# Altium footprint library PCBLIB.PcbLib: 557 footprints (part 15 of 36)
Each footprint in its own frame and in the unit in brackets; x right, y up, seen from the top. Pads: shape width x height; smd on the part's side, far side on the other; paste and mask are expansions set on the pad; w line width, h text height; cw(c..) or ccw(c..) is an arc to the next point about the centre after c.
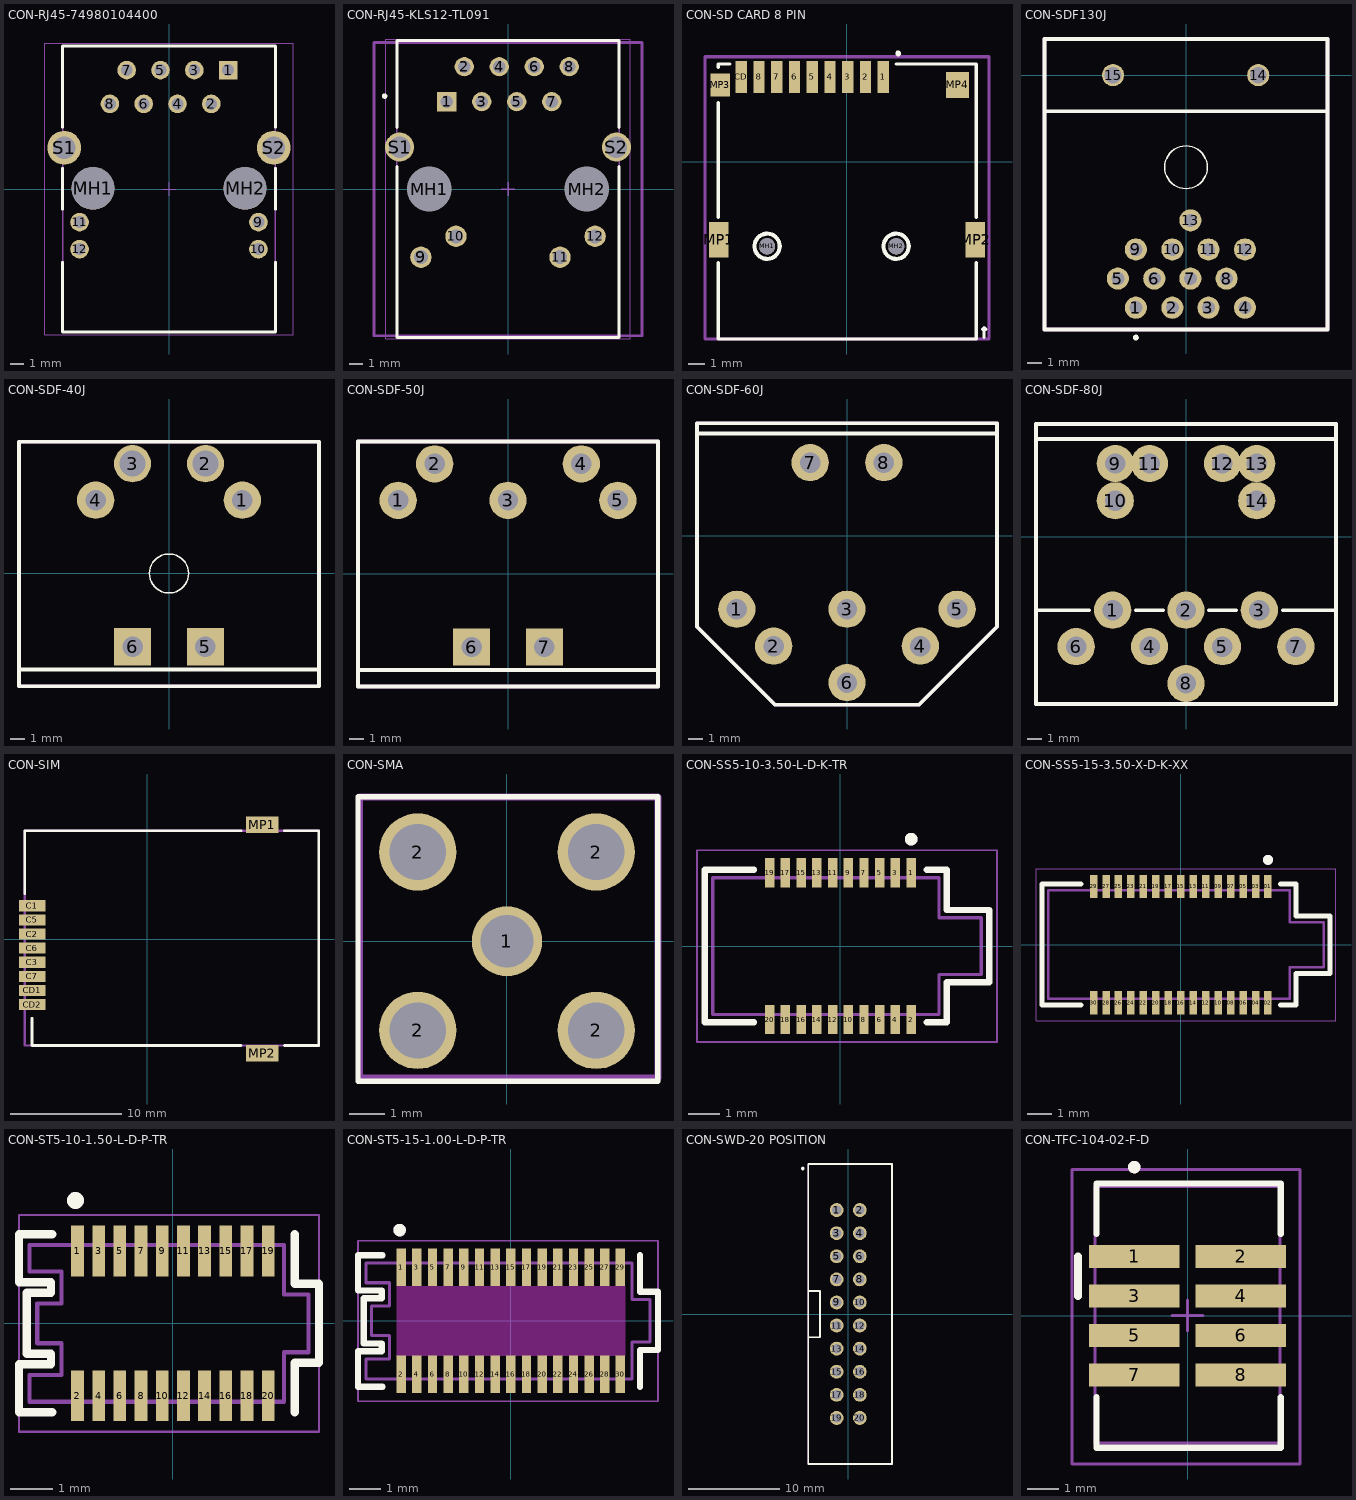
[diagram p14: the footprints below, top view; thin cyan lines are the x and y axes]

## CON-RJ45-74980104400 [mm] "10/100Base-T, THT, 1x1, Tab up, w/o shield tabs, LED L-R yellow-green/yellow-green, THR"
height 13.85
pads (16):
  rect 1.4x1.4 hole 0.89: 1(4.44,8.94)
  round 1.4 hole 0.89: 2(3.18,6.4) 3(1.9,8.94) 4(0.64,6.4) 5(-0.64,8.94) 6(-1.9,6.4) 7(-3.18,8.94) 8(-4.44,6.4) 9(6.725,-2.49) 10(6.725,-4.52) 11(-6.725,-2.49) 12(-6.725,-4.52)
  round 3.2 hole 3.2 unplated: MH1(-5.715,0.05) MH2(5.715,0.05)
  round 2.55 hole 1.7: S1(-7.875,3.1) S2(7.875,3.1)
Top Overlay:
  lines w0.2: -8,-5.5 -8,-10.75 8,-10.75 8,-5.5 ; -8,-1.51 -8,1.55 ; -8,4.65 -8,10.75 8,10.75 8,4.65 ; 8,-1.51 8,1.55
Top Paste:
  region: -3.33,7.5 -5.53,7.5 -5.53,4.7 -3.33,4.7
  region: -0.79,7.5 -2.99,7.5 -2.99,4.7 -0.79,4.7
  region: 1.75,7.5 -0.45,7.5 -0.45,4.7 1.75,4.7
  region: 4.29,7.5 2.09,7.5 2.09,4.7 4.29,4.7
  region: -2.07,7.84 -4.27,7.84 -4.27,10.64 -2.07,10.64
  region: 5.55,7.84 3.35,7.84 3.35,10.64 5.55,10.64
  region: 3.01,7.84 0.81,7.84 0.81,10.64 3.01,10.64
  region: 0.47,7.84 -1.73,7.84 -1.73,10.64 0.47,10.64
  region: -4.475,1.8 -11.275,1.8 -11.275,4.4 -4.475,4.4
  region: 11.275,1.8 4.475,1.8 4.475,4.4 11.275,4.4
  region: -8.625,-3.29 -4.825,-3.29 -4.825,-1.69 -8.625,-1.69
  region: 8.625,-3.29 4.825,-3.29 4.825,-1.69 8.625,-1.69
  region: -8.625,-5.32 -4.825,-5.32 -4.825,-3.72 -8.625,-3.72
  region: 8.625,-5.32 4.825,-5.32 4.825,-3.72 8.625,-3.72
Dimensions:
  text "The stencil layout appplied for / PCB 1.6mm and Stencil 0.15mm" at -9.47,-15.04 h1.02
Mechanical 15:
  lines w0.05: -0.5,0 0.5,0 ; 0,-0.5 0,0.5 ; -9.35,-10.95 -9.35,10.95 9.35,10.95 9.35,-10.95 -9.35,-10.95
ASM Top:
  lines w0.1: -8,-10.75 8,-10.75 8,10.75 -8,10.75 -8,-10.75
  text ".designator" at -0.244,0 h0.8
3D body "74980104400.stp": height 13.7, standoff -3, extent -8.06,-10.75 8.06,10.75

## CON-RJ45-KLS12-TL091 [mm] "MagJack, 14-Leads, Body 21.59x16.13mm"
height 13.84
pads (16):
  rect 1.4x1.4 hole 0.89: 1(-4.445,6.35)
  round 1.4 hole 0.89: 2(-3.175,8.89) 3(-1.905,6.35) 4(-0.635,8.89) 5(0.635,6.35) 6(1.905,8.89) 7(3.175,6.35) 8(4.445,8.89)
  round 1.55 hole 1.02: 9(-6.325,-4.95) 10(-3.78,-3.43) 11(3.78,-4.95) 12(6.325,-3.43)
  round 2.95 hole 3.25 unplated: MH1(-5.715,0) MH2(5.715,0)
  round 2.1 hole 1.57: S1(-7.875,3.05) S2(7.875,3.05)
Top Overlay:
  circle w0.2: c-8.966,6.756 r0.1
  lines w0.2: -8.065,1.636 -8.065,-10.79 8.065,-10.79 8.065,1.636 ; -8.065,4.464 -8.065,10.8 8.065,10.8 8.065,4.464
Mechanical 13:
  lines w0.1: -8.065,-10.79 -8.065,10.8 8.065,10.8 8.065,-10.79 -8.065,-10.79
Mechanical 15:
  lines w0.05: -8.895,-10.89 -8.895,10.9 8.895,10.9 8.895,-10.89 -8.895,-10.89
  lines w0.1: -0.5,0 0.5,0 ; 0,-0.5 0,0.5
ASM Top:
  lines w0.2: -9.724,-10.65 -9.724,10.65 9.724,10.65 9.724,-10.65 -9.724,-10.65
  text ".designator" at -0.5,0 h0.8
3D body "74990111217_Download_STP_74990111217_rev1.stp": height 15.29, standoff -3.14, extent -9.724,-10.65 9.724,10.65

## CON-SD CARD 8 PIN [mm]
pads (15):
  rect 0.7x2 smd: 1(2.25,5.25) 2(1.15,5.25) 3(0.05,5.25) 4(-1.05,5.25) 5(-2.15,5.25) 6(-3.25,5.25) 7(-4.35,5.25) 8(-5.45,5.25) CD(-6.55,5.25)
  round 1 hole 1 unplated: MH1(-4.95,-5.25) MH2(3.05,-5.25)
  rect 1.2x2.2 smd: MP1(-7.95,-4.85) MP2(7.95,-4.85)
  rect 1.2x1.4 smd: MP3(-7.85,4.75)
  rect 1.4x1.6 smd: MP4(6.85,4.75)
Top Overlay:
  circle w0.254: c-4.95,-5.25 r0.781
  circle w0.254: c3.05,-5.25 r0.781
  circle w0.254: c3.172,6.705 r0.05
  lines w0.2: -7.987,-6.25 -7.987,-11 8.013,-11 8.013,-6.25 ; -7.987,-3.45 -7.987,3.65 ; -7.987,5.85 -7.987,6.05 -7.25,6.05 ; 3.05,6.05 8.013,6.05 8.013,-3.45 ; 8.4,-10.4 8.5,-10.3 ; 8.5,-10.9 8.5,-10.3 ; 8.6,-10.4 8.5,-10.3
ASM Top:
  lines w0.2: -8.8,-11 8.8,-11 8.8,6.5 -8.8,6.5 -8.8,-11
  text ".designator" at -2.1,-3 h0.8
3D body "User Library-Socket-MicroSD.step": height 1.86, standoff -0.59, extent -8,-11.05 8,6

## CON-SDF130J [mil]
pads (15):
  round 60 hole 35: 1(-136,-631) 2(-37,-631) 3(61,-631) 4(160,-631) 5(-185,-552) 6(-86,-552) 7(12,-552) 8(110,-552) 9(-136,-473) 10(-37,-473) 11(61,-473) 12(160,-473) 13(12,-394)
  round 60 hole 45: 14(196,0) 15(-198,0)
Top Overlay:
  circle w7.87: c-136,-712 r3.94
  circle w4: c0,-250 r58.01
  lines w10: -384,-98 384,-98 ; -384,-690 -384,98 384,98 384,-690 -384,-690
ASM Top:
  lines w10: -384,-690 -384,98.03 383.72,98.03 383.72,-690 -384,-690
  text ".designator" at -293,-290 h31.5
3D body "CUI_INC_SDF-130J.step": height 787.9, standoff -133.36, extent -384,-650 383.72,98.03

## CON-SDF-40J [mil]
pads (6):
  round 100 hole 55: 1(197,197) 4(-197,197)
  round 100 hole 70: 2(98,295) 3(-98,295)
  rect 100x100 hole 55: 5(98,-197) 6(-98,-197)
Top Overlay:
  circle w4: c0,0 r52.48
  lines w10: -403,-258 403,-258 ; -403,-303 403,-303 403,354 -403,354 -403,-303
ASM Top:
  lines w10: -403,-303 403,-303 403,354 -403,354 -403,-303
  text ".designator" at -294,21 h31.5
3D body "CUI_INC_SDF-40J.step": height 843.02, standoff -137.29, extent -404,-302 410.96,327.92
3D body: height 10, standoff 0, extent -12,120 -12,120

## CON-SDF-50J [mil]
pads (7):
  round 100 hole 55: 1(-295,197) 2(-197,295) 3(0,197) 4(197,295) 5(295,197)
  rect 100x100 hole 55: 6(-98,-197) 7(98,-197)
Top Overlay:
  lines w10: -403,-259 403,-259 ; -403,-303 403,-303 403,355 -403,355 -403,-303
ASM Top:
  lines w10: -403,-303 403,-303 403,355 -403,355 -403,-303
  text ".designator" at -295,18 h31.5
3D body "CUI_INC_SDF-50J.step": height 843.02, standoff -137.29, extent -408,-301.11 406.96,317

## CON-SDF-60J [mil]
pads (8):
  round 100 hole 55: 1(-296,-197) 2(-197,-296) 3(0,-197) 4(197,-296) 5(296,-197) 6(0,-394) 7(-99,197) 8(99,197)
Top Overlay:
  lines w10: -403,275 403,275 ; -403,-244 -193,-454 193,-454 403,-244 403,303 -403,303 -403,-244
ASM Top:
  lines w10: -403,-244 -193,-454 193,-454 403,-244 403,303 -403,303 -403,-244
  text ".designator" at -348,-17 h31.5
3D body "CUI_INC_SDF-60J.step": height 843.02, standoff -137.29, extent -408,-401.69 406.96,305

## CON-SDF-80J [mil]
pads (14):
  round 100 hole 55: 1(-197,-197) 2(0,-197) 3(197,-197) 4(-98,-295) 5(98,-295) 6(-295,-295) 7(295,-295) 8(0,-394) 9(-190,197) 10(-190,97) 11(-98,197) 12(98,197) 13(190,197) 14(190,97)
Top Overlay:
  lines w10: -403,-197 -260,-197 ; -403,263 403,263 ; -135,-197 -61,-197 ; 62,-197 135,-197 ; 260,-197 403,-197 ; -403,-449 403,-449 403,303 -403,303 -403,-449
ASM Top:
  lines w10: -403,-449 -403,303 -394,303 403,303 403,-449 -403,-449
  text ".designator" at -234,-23 h31.5
3D body "CUI_INC_SDF-80J.step": height 843.02, standoff -137.29, extent -407.96,-438 407,300.19

## CON-SIM [mm] "MOLEX:0475530001,KLS:693013050811"
height 1.8
pads (10):
  rect 2.4x1 smd mask+0.2: C1(-10.35,2.995) C2(-10.349,0.445) C3(-10.349,-2.095) C5(-10.349,1.715) C6(-10.349,-0.825) C7(-10.349,-3.365) CD1(-10.349,-4.635) CD2(-10.349,-5.905)
  rect 2.95x1.5 smd mask+0.2: MP1(10.35,10.275) MP2(10.35,-10.275)
Top Overlay:
  lines w0.254: -11.03,4.105 -11.03,5.56 ; -10.383,-7.135 -10.383,-9.6 8.45,-9.6 ; 8.45,9.75 -11.029,9.75 -11.029,5.559 ; 12.35,-9.6 15.451,-9.6 15.451,9.75 12.35,9.75 ; -11.03,5.56 -11.029,5.559
ASM Top:
  lines w0.2: -11.029,-9.6 -11.029,9.75 15.47,9.75 15.47,-9.581 15.451,-9.6 -11.029,-9.6 ; -11.029,-9.6 -11.029,-9.6
  text ".designator" at 0,0 h0.8
3D body "475530001.stp": height 1.81, standoff -0.02, extent -11.029,-10.4 15.471,10.55

## CON-SMA [mm]
pads (5):
  round 2 hole 1.5: 1(0,0)
  round 2.2 hole 1.6: 2(-2.54,-2.54) 2(-2.54,2.54) 2(2.54,-2.54) 2(2.54,2.54)
Top Overlay:
  lines w0.152: -4.242,-3.988 4.293,-3.988 4.293,4.115 -4.242,4.115 -4.242,-3.988
ASM Top:
  lines w0.2: -4.2,-3.9 4.3,-3.9 4.3,4.1 -4.2,4.1 -4.2,-3.9
  text ".designator" at -0.3,-0.1 h0.8
3D body "sma.STEP": height 9.55, standoff -3.9, extent -3.155,-3.155 3.155,3.155

## CON-SS5-10-3.50-L-D-K-TR [mm] "0.50 mm pitch"
pads (20):
  rect 0.3x0.93 smd mask+0.05: 1(2.25,2.335) 2(2.25,-2.335) 3(1.75,2.335) 4(1.75,-2.335) 5(1.25,2.335) 6(1.25,-2.335) 7(0.75,2.335) 8(0.75,-2.335) 9(0.25,2.335) 10(0.25,-2.335) 11(-0.25,2.335) 12(-0.25,-2.335) 13(-0.75,2.335) 14(-0.75,-2.335) 15(-1.25,2.335) 16(-1.25,-2.335) 17(-1.75,2.335) 18(-1.75,-2.335) 19(-2.25,2.335) 20(-2.25,-2.335)
Top Overlay:
  circle w0.2: c2.25,3.4 r0.1
  lines w0.2: -2.75,-2.425 -4.31,-2.425 -4.31,2.425 -2.75,2.425 ; 2.75,-2.425 3.38,-2.425 3.38,-1.15 4.73,-1.15 4.73,1.15 3.38,1.15 3.38,2.425 2.75,2.425
Mechanical 13:
  circle w0.2: c2.25,3.4 r0.1
Mechanical 15:
  lines w0.05: -4.56,-3.05 -4.56,3.05 4.98,3.05 4.98,-3.05 -4.56,-3.05
ASM Top:
  lines w0.1: -4.06,-2.175 3.13,-2.175 3.13,-0.9 4.48,-0.9 4.48,0.9 3.13,0.9 3.13,2.175 -4.06,2.175 -4.06,-2.175
  text ".designator" at -1.25,-0.283 h0.8
3D body "SS5-10-3.50-L-D-K-TR.stp": height 4.01, standoff 0.01, extent -4.06,-2.5 4.48,2.5

## CON-SS5-15-3.50-X-D-K-XX [mm]
pads (30):
  rect 0.3x0.93 smd mask+0.051: 01(3.5,2.335) 02(3.5,-2.335) 03(3,2.335) 04(3,-2.335) 05(2.5,2.335) 06(2.5,-2.335) 07(2,2.335) 08(2,-2.335) 09(1.5,2.335) 10(1.5,-2.335) 11(1,2.335) 12(1,-2.335) 13(0.5,2.335) 14(0.5,-2.335) 15(0,2.335) 16(0,-2.335) 17(-0.5,2.335) 18(-0.5,-2.335) 19(-1,2.335) 20(-1,-2.335) 21(-1.5,2.335) 22(-1.5,-2.335) 23(-2,2.335) 24(-2,-2.335) 25(-2.5,2.335) 26(-2.5,-2.335) 27(-3,2.335) 28(-3,-2.335) 29(-3.5,2.335) 30(-3.5,-2.335)
Top Overlay:
  circle w0.2: c3.5,3.4 r0.1
  lines w0.2: -4,-2.425 -5.56,-2.425 -5.56,2.425 -4,2.425 ; 4,-2.425 4.63,-2.425 4.63,-1.15 5.98,-1.15 5.98,1.15 4.63,1.15 4.63,2.425 4,2.425
Mechanical 13:
  circle w0.2: c3.5,3.4 r0.1
Mechanical 15:
  lines w0.05: -5.81,-3.05 6.23,-3.05 6.23,3.05 -5.81,3.05 -5.81,-3.05
ASM Top:
  lines w0.1: -5.31,-2.175 -5.31,2.175 4.38,2.175 4.38,0.9 5.73,0.9 5.73,-0.9 4.38,-0.9 4.38,-2.175 -5.31,-2.175
  text ".designator" at -0.7,-0.25 h0.8
3D body "SS5-15-3.50-L-D-K-TR.stp": height 4.01, standoff 0.01, extent -5.31,-2.5 5.73,2.5

## CON-ST5-10-1.50-L-D-P-TR [mm]
pads (20):
  rect 0.3x1.2 smd mask+0.05: 1(-2.25,1.71) 2(-2.25,-1.71) 3(-1.75,1.71) 4(-1.75,-1.71) 5(-1.25,1.71) 6(-1.25,-1.71) 7(-0.75,1.71) 8(-0.75,-1.71) 9(-0.25,1.71) 10(-0.25,-1.71) 11(0.25,1.71) 12(0.25,-1.71) 13(0.75,1.71) 14(0.75,-1.71) 15(1.25,1.71) 16(1.25,-1.71) 17(1.75,1.71) 18(1.75,-1.71) 19(2.25,1.71) 20(2.25,-1.71)
Top Overlay:
  circle w0.2: c-2.3,2.9 r0.1
  lines w0.2: -2.85,-2.1 -3.63,-2.1 -3.63,-0.97 -2.875,-0.97 -2.875,-0.72 -3.45,-0.72 -3.45,0.72 -2.875,0.72 -2.875,0.97 -3.63,0.97 -3.63,2.1 -2.85,2.1 ; 2.875,-2.1 2.875,-0.93 3.45,-0.93 3.45,0.93 2.875,0.93 2.875,2.1
Mechanical 13:
  circle w0.2: c-2.3,2.9 r0.1
Mechanical 15:
  lines w0.05: -3.63,-2.56 -3.63,2.56 3.45,2.56 3.45,-2.56 -3.63,-2.56
ASM Top:
  lines w0.1: -3.38,-1.85 2.625,-1.85 2.625,-0.68 3.2,-0.68 3.2,0.68 2.625,0.68 2.625,1.85 -3.38,1.85 -3.38,1.22 -2.625,1.22 -2.625,0.47 -3.2,0.47 -3.2,-0.47 -2.625,-0.47 -2.625,-1.22 -3.38,-1.22 -3.38,-1.85
  text ".designator" at -0.7,-0.45 h0.8
3D body "ST5-10-1.50-L-D-P-TR.stp": height 4.09, standoff 0.01, extent -3.38,-2 3.2,2

## CON-ST5-15-1.00-L-D-P-TR [mm]
pads (30):
  rect 0.3x1.2 smd mask+0.05: 1(-3.5,1.71) 2(-3.5,-1.71) 3(-3,1.71) 4(-3,-1.71) 5(-2.5,1.71) 6(-2.5,-1.71) 7(-2,1.71) 8(-2,-1.71) 9(-1.5,1.71) 10(-1.5,-1.71) 11(-1,1.71) 12(-1,-1.71) 13(-0.5,1.71) 14(-0.5,-1.71) 15(0,1.71) 16(0,-1.71) 17(0.5,1.71) 18(0.5,-1.71) 19(1,1.71) 20(1,-1.71) 21(1.5,1.71) 22(1.5,-1.71) 23(2,1.71) 24(2,-1.71) 25(2.5,1.71) 26(2.5,-1.71) 27(3,1.71) 28(3,-1.71) 29(3.5,1.71) 30(3.5,-1.71)
Top Overlay:
  circle w0.2: c-3.55,2.9 r0.1
  lines w0.2: -4.1,-2.1 -4.88,-2.1 -4.88,-0.97 -4.125,-0.97 -4.125,-0.72 -4.7,-0.72 -4.7,0.72 -4.125,0.72 -4.125,0.97 -4.88,0.97 -4.88,2.1 -4.1,2.1 ; 4.125,-2.1 4.125,-0.93 4.7,-0.93 4.7,0.93 4.125,0.93 4.125,2.1
Keep-Out Layer:
  region: 3.65,-1.11 -3.65,-1.11 -3.65,1.11 3.65,1.11
Mechanical 13:
  circle w0.2: c-3.55,2.9 r0.1
Mechanical 15:
  lines w0.05: -4.88,-2.56 4.7,-2.56 4.7,2.56 -4.88,2.56 -4.88,-2.56
ASM Top:
  lines w0.1: -4.63,-1.85 -4.63,-1.22 -3.875,-1.22 -3.875,-0.47 -4.45,-0.47 -4.45,0.47 -3.875,0.47 -3.875,1.22 -4.63,1.22 -4.63,1.85 3.875,1.85 3.875,0.68 4.45,0.68 4.45,-0.68 3.875,-0.68 3.875,-1.85 -4.63,-1.85
  text ".designator" at -0.2,-0.15 h0.8
3D body "ST5-15-1.50-L-D-P-TR.stp": height 4.09, standoff 0.01, extent -4.63,-2 4.45,2

## CON-SWD-20 POSITION [mm]
pads (20):
  round 1.52 hole 1.02 mask+0.05: 1(-1.27,11.43) 2(1.27,11.43) 3(-1.27,8.89) 4(1.27,8.89) 5(-1.27,6.35) 6(1.27,6.35) 7(-1.27,3.81) 8(1.27,3.81) 9(-1.27,1.27) 10(1.27,1.27) 11(-1.27,-1.27) 12(1.27,-1.27) 13(-1.27,-3.81) 14(1.27,-3.81) 15(-1.27,-6.35) 16(1.27,-6.35) 17(-1.27,-8.89) 18(1.27,-8.89) 19(-1.27,-11.43) 20(1.27,-11.43)
Top Overlay:
  circle w0.2: c-5,16 r0.1
  lines w0.2: -4.394,-2.566 -3.124,-2.566 -3.124,2.514 -4.394,2.514 ; -4.4,-16.5 4.826,-16.5 4.826,16.5 -4.4,16.5 -4.4,-16.5
ASM Top:
  lines w0.152: -4.4,-16.5 4.826,-16.5 4.826,16.5 -4.4,16.5 -4.4,-16.5
  text ".designator" at 0,0.3 h0.8
3D body "swd 20 pin 2.54mm header.stp": height 8.89, standoff -3.3, extent -4.394,-16.536 4.877,16.484

## CON-TFC-104-02-F-D [mm]
pads (8):
  rect 2.92x0.74 smd: 1(-1.715,1.905) 2(1.715,1.905) 3(-1.715,0.635) 4(1.715,0.635) 5(-1.715,-0.635) 6(1.715,-0.635) 7(-1.715,-1.905) 8(1.715,-1.905)
Top Overlay:
  circle w0.2: c-1.715,4.78 r0.1
  lines w0.2: -2.935,-2.625 -2.935,-4.25 3,-4.25 3,-2.625 ; -2.935,2.625 -2.935,4.25 3,4.25 3,2.625
  lines w0.254: -3.525,0.635 -3.525,1.905
Mechanical 13:
  circle w0.2: c-1.715,4.78 r0.1
Mechanical 15:
  lines w0.1: -0.5,0 0.5,0 ; 0,-0.5 0,0.5 ; -3.725,-4.775 -3.725,4.7 3.625,4.7 3.625,-4.775 -3.725,-4.775
ASM Top:
  lines w0.1: -2.985,-4.105 -2.985,4.155 2.975,4.155 2.975,-4.105 -2.985,-4.105
  text ".designator" at 0,0 h1
3D body "TFC-104-02-F-D.stp": height 5.73, standoff -0.01, extent -2.985,-4.125 2.985,4.13